# Altium footprint library MyPcbLib.PcbLib: 657 footprints (part 6 of 42)
Each footprint in its own frame and in the unit in brackets; x right, y up, seen from the top. Pads: shape width x height; smd on the part's side, far side on the other; paste and mask are expansions set on the pad; w line width, h text height; cw(c..) or ccw(c..) is an arc to the next point about the centre after c.
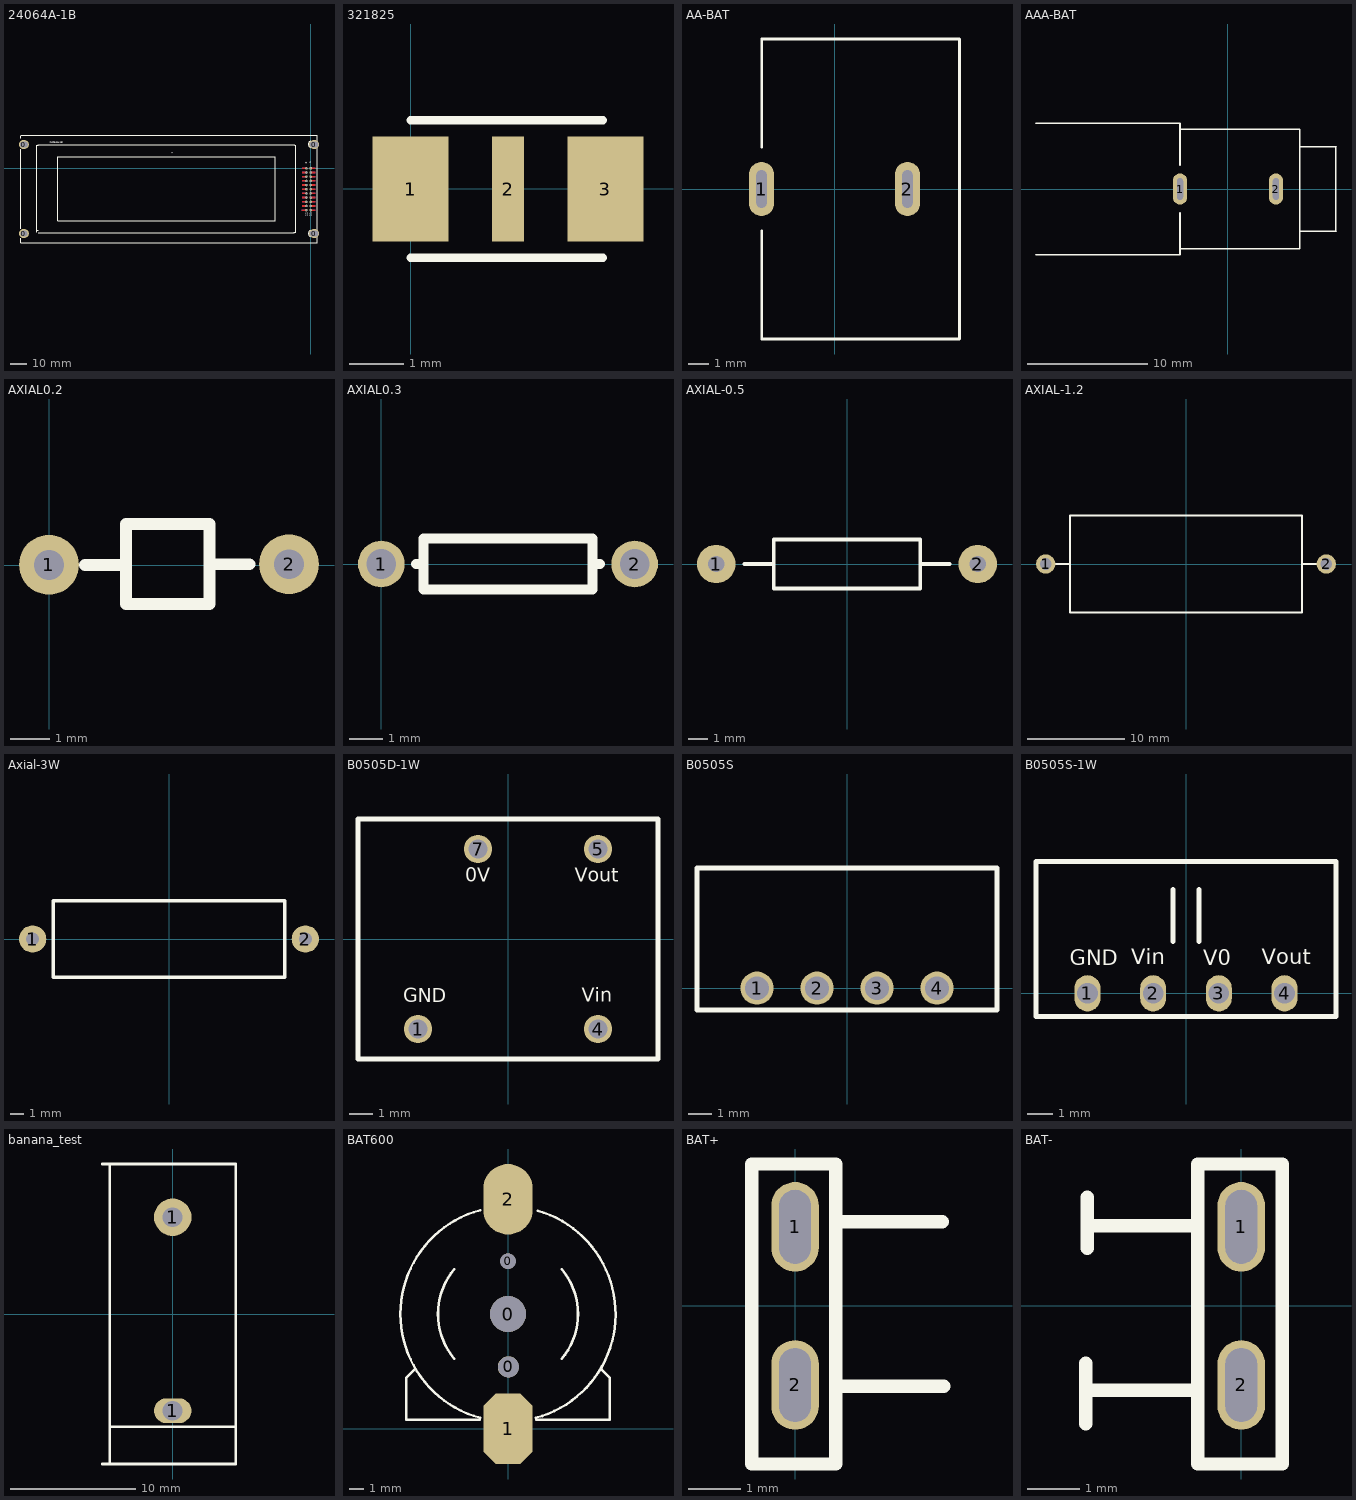
[diagram p5: the footprints below, top view; thin cyan lines are the x and y axes]

## 24064A-1B [mil]
pads (26):
  oval 236.22x216.54 hole 125.98 slot 157.48 at 0 deg: 0(-6847.52,-1557.6)
  oval 236.22x216.54 hole 137.8 slot 177.17 at 0 deg: 0(-6847.52,568.39)
  oval 236.22x216.54 hole 137.8 slot 196.85 at 0 deg: 0(81.61,-1557.6) 0(81.61,568.39)
  rect 60x60 hole 42: 1(0,0)
  round 60 hole 42: 2(-100,0) 3(0,-100) 4(-100,-100) 5(0,-200) 6(-100,-200) 7(0,-300) 8(-100,-300) 9(0,-400) 10(-100,-400) 11(0,-500) 12(-100,-500) 13(0,-600) 14(-100,-600) 15(0,-700) 16(-100,-700) 17(0,-800) 18(-100,-800) 19(0,-900) 20(-100,-900) 21(0,-1000) 22(-100,-1000)
Top Layer:
  rectangle: -15.95,-1020.79 114.05,-980.79
  rectangle: -212.95,-1019.79 -82.95,-979.79
  rectangle: -211.95,-19.79 -81.95,20.21
  rectangle: -211.95,-119.68 -81.95,-79.68
  rectangle: -211.95,-319.45 -81.95,-279.45
  rectangle: -211.95,-219.57 -81.95,-179.57
  rectangle: -211.95,-619.12 -81.95,-579.12
  rectangle: -211.95,-719.01 -81.95,-679.01
  rectangle: -211.95,-519.23 -81.95,-479.23
  rectangle: -211.95,-419.34 -81.95,-379.34
  rectangle: -211.95,-918.79 -81.95,-878.79
  rectangle: -211.95,-818.9 -81.95,-778.9
  rectangle: -15.95,-717.9 114.05,-677.9
  rectangle: -15.95,-817.79 114.05,-777.79
  rectangle: -15.95,-318.34 114.05,-278.34
  rectangle: -15.95,-418.23 114.05,-378.23
  rectangle: -15.95,-618.01 114.05,-578.01
  rectangle: -15.95,-518.12 114.05,-478.12
  rectangle: -15.95,-118.57 114.05,-78.57
  rectangle: -15.95,-218.45 114.05,-178.45
  rectangle: -15.95,-18.68 114.05,21.32
  rectangle: -14.95,-919.79 115.05,-879.79
Bottom Layer:
  rectangle: -14.95,-919.79 115.05,-879.79
  rectangle: -15.95,-18.68 114.05,21.32
  rectangle: -15.95,-218.45 114.05,-178.45
  rectangle: -15.95,-118.57 114.05,-78.57
  rectangle: -15.95,-518.12 114.05,-478.12
  rectangle: -15.95,-618.01 114.05,-578.01
  rectangle: -15.95,-418.23 114.05,-378.23
  rectangle: -15.95,-318.34 114.05,-278.34
  rectangle: -15.95,-817.79 114.05,-777.79
  rectangle: -15.95,-717.9 114.05,-677.9
  rectangle: -211.95,-818.9 -81.95,-778.9
  rectangle: -211.95,-918.79 -81.95,-878.79
  rectangle: -211.95,-419.34 -81.95,-379.34
  rectangle: -211.95,-519.23 -81.95,-479.23
  rectangle: -211.95,-719.01 -81.95,-679.01
  rectangle: -211.95,-619.12 -81.95,-579.12
  rectangle: -211.95,-219.57 -81.95,-179.57
  rectangle: -211.95,-319.45 -81.95,-279.45
  rectangle: -211.95,-119.68 -81.95,-79.68
  rectangle: -211.95,-19.79 -81.95,20.21
  rectangle: -212.95,-1019.79 -82.95,-979.79
  rectangle: -15.95,-1020.79 114.05,-980.79
Top Overlay:
  circle w5: c-6847.52,-1557.6 r68.9
  lines w5: -6536.95,-1527.79 -6536.95,549.21 -6504.95,549.21 -6504.95,559.21 -383.95,559.21 -383.95,549.21 -354.95,549.21 -354.95,-1528.79 -385.95,-1528.79 -385.95,-1536.79 -6505.95,-1536.79 ; -6536.95,-1474.79 -6505.95,-1474.79 -6505.95,-1483.79 ; -6039.95,276.21 -845.95,276.21 -845.95,-1257.79 -6041.95,-1257.79 -6041.95,276.21 -5924.95,276.21
  lines w10: -6927.95,719.13 -6927.95,763.13 ; -6926.57,-1672.48 -6926.57,-1773.66 159.37,-1773.66 159.37,785.39 ; -6926.57,-1445.48 -6926.57,450.28 ; -6926.57,785.39 160.05,785.39 ; -6920.95,635.21 -6840.95,635.21 cw(c-6840.95,586.21) -6791.95,586.21 -6791.95,546.21 cw(c-6840.95,546.21) -6840.95,497.21 ; 87.05,-1486.79 156.23,-1486.79 ; 92.05,-1486.79 0.05,-1486.79 ccw(c0.05,-1535.79) -48.95,-1535.79 -48.95,-1574.79 ccw(c0.05,-1574.79) 0.05,-1623.79 95.05,-1623.79 159.19,-1623.79 ; 156.23,642.21 95.05,642.21 1.05,642.21 ccw(c1.05,593.21) -47.95,593.21 -47.95,555.21 ccw(c1.05,555.21) 1.05,506.21 96.05,506.21 158.23,506.21
  text "22" at -73.95,-1150.79 h50
  text "21" at 25.05,-1141.79 h50
  text "1" at 17.05,121.21 h50
  text "2" at -81.95,112.21 h50
  text "24054A-1B" at -6229.95,598.21 h35
  text "+" at -3327.95,328.39 h78.74
Bottom Overlay:
  text "22" at -73.95,-1120.79 h50
  text "21" at 25.05,-1111.79 h50
  text "1" at 17.05,151.21 h50
  text "2" at -81.95,142.21 h50
Top Paste:
  rectangle: -15.95,-1020.79 114.05,-980.79
  rectangle: -212.95,-1019.79 -82.95,-979.79
  rectangle: -211.95,-19.79 -81.95,20.21
  rectangle: -211.95,-119.68 -81.95,-79.68
  rectangle: -211.95,-319.45 -81.95,-279.45
  rectangle: -211.95,-219.57 -81.95,-179.57
  rectangle: -211.95,-619.12 -81.95,-579.12
  rectangle: -211.95,-719.01 -81.95,-679.01
  rectangle: -211.95,-519.23 -81.95,-479.23
  rectangle: -211.95,-419.34 -81.95,-379.34
  rectangle: -211.95,-918.79 -81.95,-878.79
  rectangle: -211.95,-818.9 -81.95,-778.9
  rectangle: -15.95,-717.9 114.05,-677.9
  rectangle: -15.95,-817.79 114.05,-777.79
  rectangle: -15.95,-318.34 114.05,-278.34
  rectangle: -15.95,-418.23 114.05,-378.23
  rectangle: -15.95,-618.01 114.05,-578.01
  rectangle: -15.95,-518.12 114.05,-478.12
  rectangle: -15.95,-118.57 114.05,-78.57
  rectangle: -15.95,-218.45 114.05,-178.45
  rectangle: -15.95,-18.68 114.05,21.32
  rectangle: -14.95,-919.79 115.05,-879.79
Bottom Paste:
  rectangle: -212.95,-1019.79 -82.95,-979.79
  rectangle: -15.95,-1020.79 114.05,-980.79
  rectangle: -14.95,-919.79 115.05,-879.79
  rectangle: -15.95,-18.68 114.05,21.32
  rectangle: -15.95,-218.46 114.05,-178.46
  rectangle: -15.95,-118.57 114.05,-78.57
  rectangle: -15.95,-518.12 114.05,-478.12
  rectangle: -15.95,-618.01 114.05,-578.01
  rectangle: -15.95,-418.23 114.05,-378.23
  rectangle: -15.95,-318.34 114.05,-278.34
  rectangle: -15.95,-817.79 114.05,-777.79
  rectangle: -15.95,-717.9 114.05,-677.9
  rectangle: -211.95,-818.9 -81.95,-778.9
  rectangle: -211.95,-918.79 -81.95,-878.79
  rectangle: -211.95,-419.34 -81.95,-379.34
  rectangle: -211.95,-519.23 -81.95,-479.23
  rectangle: -211.95,-719.01 -81.95,-679.01
  rectangle: -211.95,-619.12 -81.95,-579.12
  rectangle: -211.95,-219.57 -81.95,-179.57
  rectangle: -211.95,-319.46 -81.95,-279.46
  rectangle: -211.95,-119.68 -81.95,-79.68
  rectangle: -211.95,-19.79 -81.95,20.21
  rectangle: -14.95,-919.79 115.05,-879.79
  rectangle: -15.95,-18.68 114.05,21.32
  rectangle: -15.95,-218.45 114.05,-178.45
  rectangle: -15.95,-118.57 114.05,-78.57
  rectangle: -15.95,-518.12 114.05,-478.12
  rectangle: -15.95,-618.01 114.05,-578.01
  rectangle: -15.95,-418.23 114.05,-378.23
  rectangle: -15.95,-318.34 114.05,-278.34
  rectangle: -15.95,-817.79 114.05,-777.79
  rectangle: -15.95,-717.9 114.05,-677.9
  rectangle: -211.95,-818.9 -81.95,-778.9
  rectangle: -211.95,-918.79 -81.95,-878.79
  rectangle: -211.95,-419.34 -81.95,-379.34
  rectangle: -211.95,-519.23 -81.95,-479.23
  rectangle: -211.95,-719.01 -81.95,-679.01
  rectangle: -211.95,-619.12 -81.95,-579.12
  rectangle: -211.95,-219.57 -81.95,-179.57
  rectangle: -211.95,-319.45 -81.95,-279.45
  rectangle: -211.95,-119.68 -81.95,-79.68
  rectangle: -211.95,-19.79 -81.95,20.21
  rectangle: -212.95,-1019.79 -82.95,-979.79
  rectangle: -15.95,-1020.79 114.05,-980.79
Top Solder:
  rectangle: -19.95,-1024.79 118.05,-976.79
  rectangle: -216.95,-1023.79 -78.95,-975.79
  rectangle: -215.95,-23.79 -77.95,24.21
  rectangle: -215.95,-123.68 -77.95,-75.68
  rectangle: -215.95,-323.45 -77.95,-275.45
  rectangle: -215.95,-223.57 -77.95,-175.57
  rectangle: -215.95,-623.12 -77.95,-575.12
  rectangle: -215.95,-723.01 -77.95,-675.01
  rectangle: -215.95,-523.23 -77.95,-475.23
  rectangle: -215.95,-423.34 -77.95,-375.34
  rectangle: -215.95,-922.79 -77.95,-874.79
  rectangle: -215.95,-822.9 -77.95,-774.9
  rectangle: -19.95,-721.9 118.05,-673.9
  rectangle: -19.95,-821.79 118.05,-773.79
  rectangle: -19.95,-322.34 118.05,-274.34
  rectangle: -19.95,-422.23 118.05,-374.23
  rectangle: -19.95,-622.01 118.05,-574.01
  rectangle: -19.95,-522.12 118.05,-474.12
  rectangle: -19.95,-122.57 118.05,-74.57
  rectangle: -19.95,-222.45 118.05,-174.45
  rectangle: -19.95,-22.68 118.05,25.32
  rectangle: -18.95,-923.79 119.05,-875.79
Bottom Solder:
  rectangle: -216.95,-1023.79 -78.95,-975.79
  rectangle: -19.95,-1024.79 118.05,-976.79
  rectangle: -18.95,-923.79 119.05,-875.79
  rectangle: -19.95,-22.68 118.05,25.32
  rectangle: -19.95,-222.46 118.05,-174.46
  rectangle: -19.95,-122.57 118.05,-74.57
  rectangle: -19.95,-522.12 118.05,-474.12
  rectangle: -19.95,-622.01 118.05,-574.01
  rectangle: -19.95,-422.23 118.05,-374.23
  rectangle: -19.95,-322.34 118.05,-274.34
  rectangle: -19.95,-821.79 118.05,-773.79
  rectangle: -19.95,-721.9 118.05,-673.9
  rectangle: -215.95,-822.9 -77.95,-774.9
  rectangle: -215.95,-922.79 -77.95,-874.79
  rectangle: -215.95,-423.34 -77.95,-375.34
  rectangle: -215.95,-523.23 -77.95,-475.23
  rectangle: -215.95,-723.01 -77.95,-675.01
  rectangle: -215.95,-623.12 -77.95,-575.12
  rectangle: -215.95,-223.57 -77.95,-175.57
  rectangle: -215.95,-323.46 -77.95,-275.46
  rectangle: -215.95,-123.68 -77.95,-75.68
  rectangle: -215.95,-23.79 -77.95,24.21
  rectangle: -18.95,-923.79 119.05,-875.79
  rectangle: -19.95,-22.68 118.05,25.32
  rectangle: -19.95,-222.45 118.05,-174.45
  rectangle: -19.95,-122.57 118.05,-74.57
  rectangle: -19.95,-522.12 118.05,-474.12
  rectangle: -19.95,-622.01 118.05,-574.01
  rectangle: -19.95,-422.23 118.05,-374.23
  rectangle: -19.95,-322.34 118.05,-274.34
  rectangle: -19.95,-821.79 118.05,-773.79
  rectangle: -19.95,-721.9 118.05,-673.9
  rectangle: -215.95,-822.9 -77.95,-774.9
  rectangle: -215.95,-922.79 -77.95,-874.79
  rectangle: -215.95,-423.34 -77.95,-375.34
  rectangle: -215.95,-523.23 -77.95,-475.23
  rectangle: -215.95,-723.01 -77.95,-675.01
  rectangle: -215.95,-623.12 -77.95,-575.12
  rectangle: -215.95,-223.57 -77.95,-175.57
  rectangle: -215.95,-323.45 -77.95,-275.45
  rectangle: -215.95,-123.68 -77.95,-75.68
  rectangle: -215.95,-23.79 -77.95,24.21
  rectangle: -216.95,-1023.79 -78.95,-975.79
  rectangle: -19.95,-1024.79 118.05,-976.79

## 321825 [mm]
pads (3):
  rect 1.4x1.94 smd: 1(0,-0.007) 3(3.6,-0.007)
  rect 0.6x1.94 smd: 2(1.8,-0.007)
Top Overlay:
  lines w0.152: 0,-1.277 3.556,-1.277 ; 0,1.263 3.556,1.263

## AA-BAT [mm]
pads (2):
  oval 1.2x2.6 hole 0.5 slot 1.8 at 90 deg: 1(-3.5,0) 2(3.5,0)
Top Overlay:
  lines w0.127: -3.5,-2 -3.5,-7.2 6,-7.2 6,7.2 -3.5,7.2 -3.5,2

## AAA-BAT [mm]
pads (2):
  oval 1.2x2.6 hole 0.5 slot 1.8 at 90 deg: 1(-4,0) 2(4,0)
Top Overlay:
  lines w0.127: -16.006,-5.5 -4,-5.5 -4,-2 ; -16.006,5.5 -4,5.5 -4,2 ; -4,-5 6,-5 6,5 -4,5 ; 6,-3.505 9.005,-3.505 ; 6,3.505 9.005,3.505 ; 9,-3.5 9,3.5

## AXIAL0.2 [mil]
pads (2):
  round 60 hole 30: 1(-0.2,0.4) 2(240.3,0.95)
Top Overlay:
  lines w12: 36.12,0.4 76.12,0.4 ; 160.5,0.95 200.5,0.95 ; 76.85,-38.8 160.5,-38.8 160.5,41.2 76.85,41.2 76.85,-38.8

## AXIAL0.3 [mm]
pads (2):
  round 1.4 hole 0.9: 1(-0.005,0.009) 2(7.615,0.009)
Top Overlay:
  lines w0.305: 1.036,0.009 1.265,0.009 ; 6.573,0.009 6.345,0.009 ; 6.345,0.009 6.345,-0.753 1.265,-0.753 1.265,0.771 6.345,0.771 6.345,0.009

## AXIAL-0.5 [mm] "Axial Devic"
height 2.54
pads (2):
  round 2 hole 0.85: 1(-6.8,0) 2(6.8,0)
Top Overlay:
  lines w0.2: -5.334,0 -3.81,0 ; 3.81,0 5.334,0 ; -3.81,-1.27 3.81,-1.27 3.81,1.27 -3.81,1.27 -3.81,-1.27
3D body: height 0.27, standoff -4.27, extent -7.151,-1.27 7.049,1.27

## AXIAL-1.2 [mm]
pads (2):
  round 2 hole 1.2: 1(-14.5,0) 2(14.5,0)
Top Overlay:
  lines w0.203: -13.5,0 -12,0 ; 12,0 13.5,0 ; -12,-5 -12,5 12,5 12,-5 -12,-5

## Axial-3W [mm]
pads (2):
  round 2 hole 0.965: 1(-10,0) 2(10,0)
Top Overlay:
  lines w0.254: -8.5,-2.8 -8.5,2.8 8.5,2.8 8.5,-2.8 -8.5,-2.8

## B0505D-1W [mm]
pads (4):
  round 1.2 hole 0.8: 1(-3.81,-3.81) 4(3.81,-3.81) 5(3.81,3.81) 7(-1.27,3.81)
Top Overlay:
  lines w0.203: -6.35,-5.08 -6.35,5.08 6.35,5.08 6.35,-5.08 -6.35,-5.08
  text "GND" at -4.445,-2.896 h1.02
  text "Vin" at 3.124,-2.87 h1.02
  text "Vout" at 2.819,2.21 h1.02
  text "0V" at -1.803,2.21 h1.02
3D body: height 8.45, standoff -1.35, extent -6.426,-5 6.274,5

## B0505S [mm]
pads (4):
  round 1.4 hole 1: 1(-3.81,0) 2(-1.27,0) 3(1.27,0) 4(3.81,0)
Top Overlay:
  lines w0.203: -6.35,-0.92 -6.35,0 -6.35,5.08 6.35,5.08 6.35,-0.92 -6.35,-0.92

## B0505S-1W [mm]
pads (4):
  oval 1x1.4 hole 0.8: 1(-3.81,0) 2(-1.27,0) 3(1.27,0) 4(3.81,0)
Top Overlay:
  lines w0.203: -0.5,2 -0.5,4 ; 0.5,2 0.5,4 ; -5.8,-0.9 -5.8,5.1 5.789,5.1 5.8,5.089 5.8,-0.9 -5.8,-0.9
  text "GND" at -4.496,0.889 h1.02
  text "V0" at 0.66,0.889 h1.02
  text "Vout" at 2.921,0.94 h1.02
  text "Vin" at -2.108,0.94 h1.02
3D body: height 10.25, standoff -1.75, extent -5.775,-0.92 5.825,5.08

## banana_test [mm] "带针焊接PCB线路板焊板香蕉插座4mm测试插头大电流banana面板插座"
pads (2):
  oval 3x2 hole 1.6: 1(0,-7.75)
  round 3 hole 1.6: 1(0,7.75)
Top Overlay:
  lines w0.203: -5.645,-12.014 5.055,-12.014 ; -5.645,12.014 5.055,12.014 ; -5.055,-9.014 5.004,-9.014 ; -5.05,-12 -5.05,12 ; 5.05,-12 5.05,12
3D body: height 13, standoff -3, extent -5.05,-11.847 5.05,12.153

## BAT600 [mm]
pads (5):
  round 2.54 hole 2.54: 0(-0.01,8.13)
  round 1.1 hole 1.1: 0(-0.01,11.88)
  round 1.5 hole 1.5: 0(0.015,4.38)
  oct 3.5x5 smd: 1(-0.01,0.002)
  oval 3.5x5 smd: 2(-0.01,16.258)
Top Overlay:
  lines w0.178: -6.61,4.23 -7.21,3.63 -7.21,0.63 -2.01,0.63 ; -3.824,4.96 cw(c-0.01,8.13) -3.822,11.302 ; -1.973,0.767 cw(c-0.01,8.13) -7.63,8.13 cw(c-0.01,8.13) -1.973,15.492 ; 1.954,0.767 ccw(c-0.01,8.13) 2.084,15.456 ; 1.99,0.63 7.19,0.63 7.19,3.63 6.615,4.205 ; 3.8,4.955 ccw(c-0.01,8.13) 3.803,11.302

## BAT+ [mm]
pads (2):
  oval 0.9x1.7 hole 0.6 slot 1.4 at 90 deg: 1(0,1.5) 2(0,-1.5)
Top Overlay:
  lines w0.254: 0.813,-1.525 2.819,-1.525 ; 0.838,1.599 2.794,1.599 ; -0.825,-3 -0.825,2.691 0.775,2.691 0.775,-3 -0.825,-3

## BAT- [mm]
pads (2):
  oval 0.9x1.7 hole 0.6 slot 1.4 at 90 deg: 1(0,1.5) 2(0,-1.5)
Top Overlay:
  lines w0.254: -2.946,-2.235 -2.946,-1.092 ; -2.921,1.092 -2.921,2.057 ; -2.87,-1.602 -0.864,-1.602 ; -2.845,1.523 -0.889,1.523 ; -0.825,-3 -0.825,2.691 0.775,2.691 0.775,-3 -0.825,-3